# Altium footprint library FOOTPRINT.PcbLib: 132 footprints (part 4 of 9)
Each footprint in its own frame and in the unit in brackets; x right, y up, seen from the top. Pads: shape width x height; smd on the part's side, far side on the other; paste and mask are expansions set on the pad; w line width, h text height; cw(c..) or ccw(c..) is an arc to the next point about the centre after c.
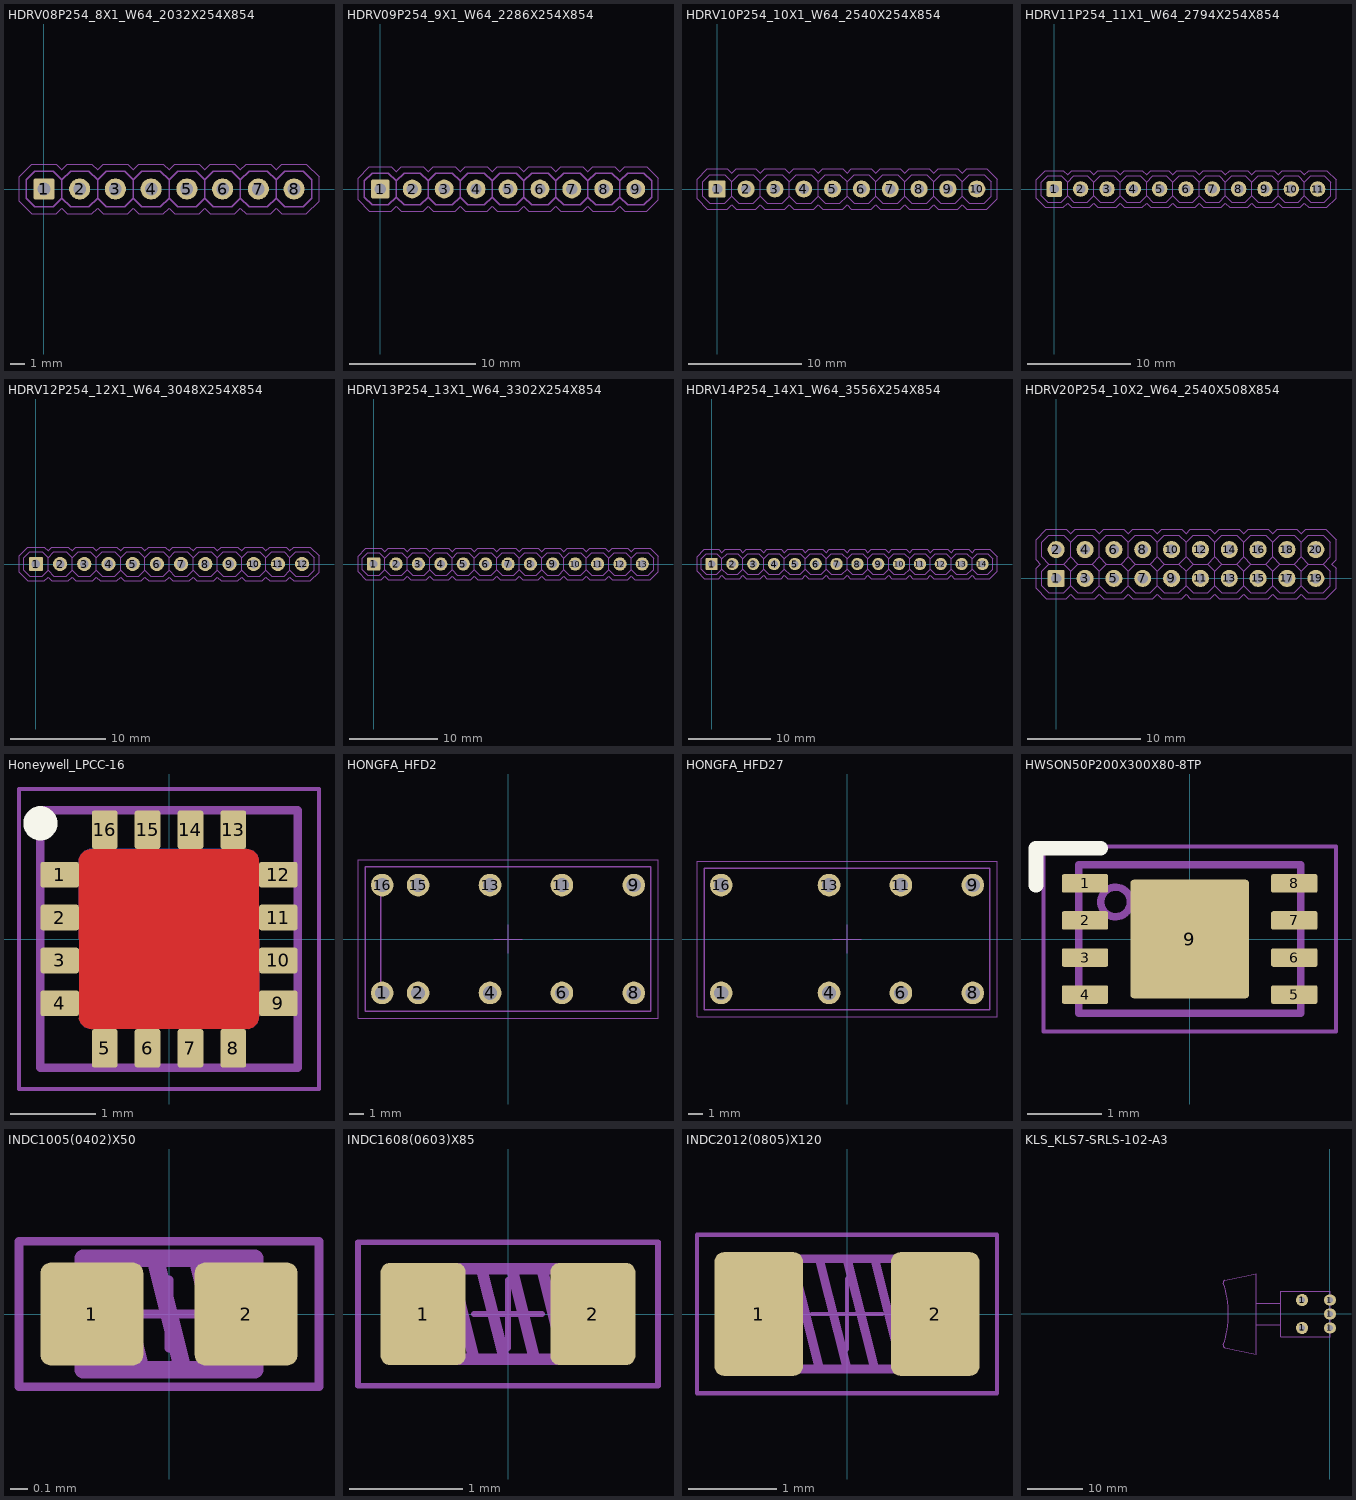
[diagram p3: the footprints below, top view; thin cyan lines are the x and y axes]

## HDRV08P254_8X1_W64_2032X254X854 [mm] "PLS-08, 2.54mm, 1 Row, Body 20.32x2.54mm, Lead Width 0.64mm"
height 8.54
pads (8):
  rrect20% 1.5x1.5 hole 0.9: 1(0,0)
  round 1.5 hole 0.9: 2(2.54,0) 3(5.08,0) 4(7.62,0) 5(10.16,0) 6(12.7,0) 7(15.24,0) 8(17.78,0)
Top Assembly:
  lines w0.1: 1.27,-0.65 1.27,0.65 ; 1.27,-0.65 1.89,-1.27 3.19,-1.27 3.81,-0.65 ; 1.27,-0.65 0.65,-1.27 -0.65,-1.27 -1.27,-0.65 -1.27,0.65 -0.65,1.27 0.65,1.27 1.27,0.65 ; 1.27,0.65 1.89,1.27 3.19,1.27 3.81,0.65 ; 3.81,-0.65 4.43,-1.27 5.73,-1.27 6.35,-0.65 ; 3.81,-0.65 3.81,0.65 ; 3.81,0.65 4.43,1.27 5.73,1.27 6.35,0.65 ; 6.35,-0.65 6.97,-1.27 8.27,-1.27 8.89,-0.65 ; 6.35,-0.65 6.35,0.65 ; 6.35,0.65 6.97,1.27 8.27,1.27 8.89,0.65 ; 8.89,-0.65 9.51,-1.27 10.81,-1.27 11.43,-0.65 ; 8.89,-0.65 8.89,0.65 ; 8.89,0.65 9.51,1.27 10.81,1.27 11.43,0.65 ; 11.43,-0.65 12.05,-1.27 13.35,-1.27 13.97,-0.65 ; 11.43,-0.65 11.43,0.65 ; 11.43,0.65 12.05,1.27 13.35,1.27 13.97,0.65 ; 13.97,-0.65 14.59,-1.27 15.89,-1.27 16.51,-0.65 ; 13.97,-0.65 13.97,0.65 ; 13.97,0.65 14.59,1.27 15.89,1.27 16.51,0.65 ; 16.51,-0.65 17.13,-1.27 18.43,-1.27 19.05,-0.65 19.05,0.65 18.43,1.27 17.13,1.27 16.51,0.65 ; 16.51,-0.65 16.51,0.65 ; -0.325,-0.325 0.325,-0.325 0.325,0.325 -0.325,0.325 -0.325,-0.325 ; 2.215,-0.325 2.215,0.325 2.865,0.325 2.865,-0.325 2.215,-0.325 ; 4.755,-0.325 4.755,0.325 5.405,0.325 5.405,-0.325 4.755,-0.325 ; 7.295,-0.325 7.945,-0.325 7.945,0.325 7.295,0.325 7.295,-0.325 ; 9.835,-0.325 9.835,0.325 10.485,0.325 10.485,-0.325 9.835,-0.325 ; 12.375,-0.325 13.025,-0.325 13.025,0.325 12.375,0.325 12.375,-0.325 ; 14.915,-0.325 15.565,-0.325 15.565,0.325 14.915,0.325 14.915,-0.325 ; 17.455,-0.325 17.455,0.325 18.105,0.325 18.105,-0.325 17.455,-0.325
Top Courtyard:
  lines w0.05: -1.775,-0.875 -1.775,0.875 -0.875,1.775 0.875,1.775 1.27,1.38 1.665,1.775 3.415,1.775 3.81,1.38 4.205,1.775 5.955,1.775 6.35,1.38 6.745,1.775 8.495,1.775 8.89,1.38 9.285,1.775 11.035,1.775 11.43,1.38 11.825,1.775 13.575,1.775 13.97,1.38 14.365,1.775 16.115,1.775 16.51,1.38 16.905,1.775 18.655,1.775 19.555,0.875 19.555,-0.875 18.655,-1.775 16.905,-1.775 16.51,-1.38 16.115,-1.775 14.365,-1.775 13.97,-1.38 13.575,-1.775 11.825,-1.775 11.43,-1.38 11.035,-1.775 9.285,-1.775 8.89,-1.38 8.495,-1.775 6.745,-1.775 6.35,-1.38 5.955,-1.775 4.205,-1.775 3.81,-1.38 3.415,-1.775 1.665,-1.775 1.27,-1.38 0.875,-1.775 -0.875,-1.775 -1.775,-0.875
Top Component Center:
  lines w0.05: -0.5,0 0.5,0 ; 0,-0.5 0,0.5
Top Designator:
  text "'.Comment'" at -1.14,1.48 h0.65
  text "'.Designator'" at -1.14,2.183 h0.65
3D body "PLS_PLS-08.x_t": height 8.54, standoff -3, extent -1.27,-1.27 19.05,1.27

## HDRV09P254_9X1_W64_2286X254X854 [mm] "PLS-09, 2.54mm, 1 Row, Body 22.86x2.54mm, Lead Width 0.64mm"
height 8.54
pads (9):
  rrect20% 1.5x1.5 hole 0.9: 1(0,0)
  round 1.5 hole 0.9: 2(2.54,0) 3(5.08,0) 4(7.62,0) 5(10.16,0) 6(12.7,0) 7(15.24,0) 8(17.78,0) 9(20.32,0)
Top Assembly:
  lines w0.1: 1.27,-0.65 0.65,-1.27 -0.65,-1.27 -1.27,-0.65 -1.27,0.65 -0.65,1.27 0.65,1.27 1.27,0.65 ; 1.27,-0.65 1.89,-1.27 3.19,-1.27 3.81,-0.65 ; 1.27,-0.65 1.27,0.65 ; 1.27,0.65 1.89,1.27 3.19,1.27 3.81,0.65 ; 3.81,-0.65 3.81,0.65 ; 3.81,-0.65 4.43,-1.27 5.73,-1.27 6.35,-0.65 ; 3.81,0.65 4.43,1.27 5.73,1.27 6.35,0.65 ; 6.35,-0.65 6.35,0.65 ; 6.35,-0.65 6.97,-1.27 8.27,-1.27 8.89,-0.65 ; 6.35,0.65 6.97,1.27 8.27,1.27 8.89,0.65 ; 8.89,-0.65 8.89,0.65 ; 8.89,-0.65 9.51,-1.27 10.81,-1.27 11.43,-0.65 ; 8.89,0.65 9.51,1.27 10.81,1.27 11.43,0.65 ; 11.43,-0.65 11.43,0.65 ; 11.43,-0.65 12.05,-1.27 13.35,-1.27 13.97,-0.65 ; 11.43,0.65 12.05,1.27 13.35,1.27 13.97,0.65 ; 13.97,-0.65 13.97,0.65 ; 13.97,-0.65 14.59,-1.27 15.89,-1.27 16.51,-0.65 ; 13.97,0.65 14.59,1.27 15.89,1.27 16.51,0.65 ; 16.51,-0.65 16.51,0.65 ; 16.51,-0.65 17.13,-1.27 18.43,-1.27 19.05,-0.65 ; 16.51,0.65 17.13,1.27 18.43,1.27 19.05,0.65 ; 19.05,-0.65 19.05,0.65 ; 19.05,-0.65 19.67,-1.27 20.97,-1.27 21.59,-0.65 21.59,0.65 20.97,1.27 19.67,1.27 19.05,0.65 ; -0.325,-0.325 -0.325,0.325 0.325,0.325 0.325,-0.325 -0.325,-0.325 ; 2.215,-0.325 2.865,-0.325 2.865,0.325 2.215,0.325 2.215,-0.325 ; 4.755,-0.325 4.755,0.325 5.405,0.325 5.405,-0.325 4.755,-0.325 ; 7.295,-0.325 7.295,0.325 7.945,0.325 7.945,-0.325 7.295,-0.325 ; 9.835,-0.325 10.485,-0.325 10.485,0.325 9.835,0.325 9.835,-0.325 ; 12.375,-0.325 12.375,0.325 13.025,0.325 13.025,-0.325 12.375,-0.325 ; 14.915,-0.325 15.565,-0.325 15.565,0.325 14.915,0.325 14.915,-0.325 ; 17.455,-0.325 18.105,-0.325 18.105,0.325 17.455,0.325 17.455,-0.325 ; 19.995,-0.325 19.995,0.325 20.645,0.325 20.645,-0.325 19.995,-0.325
Top Courtyard:
  lines w0.05: -1.775,-0.875 -0.875,-1.775 0.875,-1.775 1.27,-1.38 1.665,-1.775 3.415,-1.775 3.81,-1.38 4.205,-1.775 5.955,-1.775 6.35,-1.38 6.745,-1.775 8.495,-1.775 8.89,-1.38 9.285,-1.775 11.035,-1.775 11.43,-1.38 11.825,-1.775 13.575,-1.775 13.97,-1.38 14.365,-1.775 16.115,-1.775 16.51,-1.38 16.905,-1.775 18.655,-1.775 19.05,-1.38 19.445,-1.775 21.195,-1.775 22.095,-0.875 22.095,0.875 21.195,1.775 19.445,1.775 19.05,1.38 18.655,1.775 16.905,1.775 16.51,1.38 16.115,1.775 14.365,1.775 13.97,1.38 13.575,1.775 11.825,1.775 11.43,1.38 11.035,1.775 9.285,1.775 8.89,1.38 8.495,1.775 6.745,1.775 6.35,1.38 5.955,1.775 4.205,1.775 3.81,1.38 3.415,1.775 1.665,1.775 1.27,1.38 0.875,1.775 -0.875,1.775 -1.775,0.875 -1.775,-0.875
Top Component Center:
  lines w0.05: -0.5,0 0.5,0 ; 0,-0.5 0,0.5
Top Designator:
  text "'.Designator'" at -1.14,2.183 h0.65
  text "'.Comment'" at -1.14,1.48 h0.65
3D body "PLS_PLS-09.x_t": height 8.54, standoff -3, extent -1.27,-1.27 21.59,1.27

## HDRV10P254_10X1_W64_2540X254X854 [mm] "PLS-10, 2.54mm, 1 Row, Body 25.40x2.54mm, Lead Width 0.64mm"
height 8.54
pads (10):
  rrect20% 1.5x1.5 hole 0.9: 1(0,0)
  round 1.5 hole 0.9: 2(2.54,0) 3(5.08,0) 4(7.62,0) 5(10.16,0) 6(12.7,0) 7(15.24,0) 8(17.78,0) 9(20.32,0) 10(22.86,0)
Top Assembly:
  lines w0.1: 1.27,-0.65 0.65,-1.27 -0.65,-1.27 -1.27,-0.65 -1.27,0.65 -0.65,1.27 0.65,1.27 1.27,0.65 ; 1.27,-0.65 1.89,-1.27 3.19,-1.27 3.81,-0.65 ; 1.27,-0.65 1.27,0.65 ; 1.27,0.65 1.89,1.27 3.19,1.27 3.81,0.65 ; 3.81,-0.65 3.81,0.65 ; 3.81,-0.65 4.43,-1.27 5.73,-1.27 6.35,-0.65 ; 3.81,0.65 4.43,1.27 5.73,1.27 6.35,0.65 ; 6.35,-0.65 6.35,0.65 ; 6.35,-0.65 6.97,-1.27 8.27,-1.27 8.89,-0.65 ; 6.35,0.65 6.97,1.27 8.27,1.27 8.89,0.65 ; 8.89,-0.65 8.89,0.65 ; 8.89,-0.65 9.51,-1.27 10.81,-1.27 11.43,-0.65 ; 8.89,0.65 9.51,1.27 10.81,1.27 11.43,0.65 ; 11.43,-0.65 11.43,0.65 ; 11.43,-0.65 12.05,-1.27 13.35,-1.27 13.97,-0.65 ; 11.43,0.65 12.05,1.27 13.35,1.27 13.97,0.65 ; 13.97,-0.65 13.97,0.65 ; 13.97,-0.65 14.59,-1.27 15.89,-1.27 16.51,-0.65 ; 13.97,0.65 14.59,1.27 15.89,1.27 16.51,0.65 ; 16.51,-0.65 16.51,0.65 ; 16.51,-0.65 17.13,-1.27 18.43,-1.27 19.05,-0.65 ; 16.51,0.65 17.13,1.27 18.43,1.27 19.05,0.65 ; 19.05,-0.65 19.05,0.65 ; 19.05,-0.65 19.67,-1.27 20.97,-1.27 21.59,-0.65 ; 19.05,0.65 19.67,1.27 20.97,1.27 21.59,0.65 ; 21.59,-0.65 21.59,0.65 ; 21.59,-0.65 22.21,-1.27 23.51,-1.27 24.13,-0.65 24.13,0.65 23.51,1.27 22.21,1.27 21.59,0.65 ; -0.325,-0.325 -0.325,0.325 0.325,0.325 0.325,-0.325 -0.325,-0.325 ; 2.215,-0.325 2.215,0.325 2.865,0.325 2.865,-0.325 2.215,-0.325 ; 4.755,-0.325 5.405,-0.325 5.405,0.325 4.755,0.325 4.755,-0.325 ; 7.295,-0.325 7.295,0.325 7.945,0.325 7.945,-0.325 7.295,-0.325 ; 9.835,-0.325 9.835,0.325 10.485,0.325 10.485,-0.325 9.835,-0.325 ; 12.375,-0.325 13.025,-0.325 13.025,0.325 12.375,0.325 12.375,-0.325 ; 14.915,-0.325 14.915,0.325 15.565,0.325 15.565,-0.325 14.915,-0.325 ; 17.455,-0.325 18.105,-0.325 18.105,0.325 17.455,0.325 17.455,-0.325 ; 19.995,-0.325 20.645,-0.325 20.645,0.325 19.995,0.325 19.995,-0.325 ; 22.535,-0.325 22.535,0.325 23.185,0.325 23.185,-0.325 22.535,-0.325
Top Courtyard:
  lines w0.05: -1.775,-0.875 -0.875,-1.775 0.875,-1.775 1.27,-1.38 1.665,-1.775 3.415,-1.775 3.81,-1.38 4.205,-1.775 5.955,-1.775 6.35,-1.38 6.745,-1.775 8.495,-1.775 8.89,-1.38 9.285,-1.775 11.035,-1.775 11.43,-1.38 11.825,-1.775 13.575,-1.775 13.97,-1.38 14.365,-1.775 16.115,-1.775 16.51,-1.38 16.905,-1.775 18.655,-1.775 19.05,-1.38 19.445,-1.775 21.195,-1.775 21.59,-1.38 21.985,-1.775 23.735,-1.775 24.635,-0.875 24.635,0.875 23.735,1.775 21.985,1.775 21.59,1.38 21.195,1.775 19.445,1.775 19.05,1.38 18.655,1.775 16.905,1.775 16.51,1.38 16.115,1.775 14.365,1.775 13.97,1.38 13.575,1.775 11.825,1.775 11.43,1.38 11.035,1.775 9.285,1.775 8.89,1.38 8.495,1.775 6.745,1.775 6.35,1.38 5.955,1.775 4.205,1.775 3.81,1.38 3.415,1.775 1.665,1.775 1.27,1.38 0.875,1.775 -0.875,1.775 -1.775,0.875 -1.775,-0.875
Top Component Center:
  lines w0.05: -0.5,0 0.5,0 ; 0,-0.5 0,0.5
Top Designator:
  text "'.Designator'" at -1.14,2.183 h0.65
  text "'.Comment'" at -1.14,1.48 h0.65
3D body "PLS_PLS-10.x_t": height 8.54, standoff -3, extent -1.27,-1.27 24.13,1.27

## HDRV11P254_11X1_W64_2794X254X854 [mm] "PLS-11, 2.54mm, 1 Row, Body 27.94x2.54mm, Lead Width 0.64mm"
height 8.54
pads (11):
  rrect20% 1.5x1.5 hole 0.9: 1(0,0)
  round 1.5 hole 0.9: 2(2.54,0) 3(5.08,0) 4(7.62,0) 5(10.16,0) 6(12.7,0) 7(15.24,0) 8(17.78,0) 9(20.32,0) 10(22.86,0) 11(25.4,0)
Top Assembly:
  lines w0.1: 1.27,-0.65 1.27,0.65 ; 1.27,-0.65 1.89,-1.27 3.19,-1.27 3.81,-0.65 ; 1.27,-0.65 0.65,-1.27 -0.65,-1.27 -1.27,-0.65 -1.27,0.65 -0.65,1.27 0.65,1.27 1.27,0.65 ; 1.27,0.65 1.89,1.27 3.19,1.27 3.81,0.65 ; 3.81,-0.65 4.43,-1.27 5.73,-1.27 6.35,-0.65 ; 3.81,-0.65 3.81,0.65 ; 3.81,0.65 4.43,1.27 5.73,1.27 6.35,0.65 ; 6.35,-0.65 6.97,-1.27 8.27,-1.27 8.89,-0.65 ; 6.35,-0.65 6.35,0.65 ; 6.35,0.65 6.97,1.27 8.27,1.27 8.89,0.65 ; 8.89,-0.65 9.51,-1.27 10.81,-1.27 11.43,-0.65 ; 8.89,-0.65 8.89,0.65 ; 8.89,0.65 9.51,1.27 10.81,1.27 11.43,0.65 ; 11.43,-0.65 12.05,-1.27 13.35,-1.27 13.97,-0.65 ; 11.43,-0.65 11.43,0.65 ; 11.43,0.65 12.05,1.27 13.35,1.27 13.97,0.65 ; 13.97,-0.65 14.59,-1.27 15.89,-1.27 16.51,-0.65 ; 13.97,-0.65 13.97,0.65 ; 13.97,0.65 14.59,1.27 15.89,1.27 16.51,0.65 ; 16.51,-0.65 17.13,-1.27 18.43,-1.27 19.05,-0.65 ; 16.51,-0.65 16.51,0.65 ; 16.51,0.65 17.13,1.27 18.43,1.27 19.05,0.65 ; 19.05,-0.65 19.67,-1.27 20.97,-1.27 21.59,-0.65 ; 19.05,-0.65 19.05,0.65 ; 19.05,0.65 19.67,1.27 20.97,1.27 21.59,0.65 ; 21.59,-0.65 22.21,-1.27 23.51,-1.27 24.13,-0.65 ; 21.59,-0.65 21.59,0.65 ; 21.59,0.65 22.21,1.27 23.51,1.27 24.13,0.65 ; 24.13,-0.65 24.75,-1.27 26.05,-1.27 26.67,-0.65 26.67,0.65 26.05,1.27 24.75,1.27 24.13,0.65 ; 24.13,-0.65 24.13,0.65 ; -0.325,-0.325 0.325,-0.325 0.325,0.325 -0.325,0.325 -0.325,-0.325 ; 2.215,-0.325 2.215,0.325 2.865,0.325 2.865,-0.325 2.215,-0.325 ; 4.755,-0.325 4.755,0.325 5.405,0.325 5.405,-0.325 4.755,-0.325 ; 7.295,-0.325 7.945,-0.325 7.945,0.325 7.295,0.325 7.295,-0.325 ; 9.835,-0.325 9.835,0.325 10.485,0.325 10.485,-0.325 9.835,-0.325 ; 12.375,-0.325 12.375,0.325 13.025,0.325 13.025,-0.325 12.375,-0.325 ; 14.915,-0.325 15.565,-0.325 15.565,0.325 14.915,0.325 14.915,-0.325 ; 17.455,-0.325 17.455,0.325 18.105,0.325 18.105,-0.325 17.455,-0.325 ; 19.995,-0.325 20.645,-0.325 20.645,0.325 19.995,0.325 19.995,-0.325 ; 22.535,-0.325 23.185,-0.325 23.185,0.325 22.535,0.325 22.535,-0.325 ; 25.075,-0.325 25.075,0.325 25.725,0.325 25.725,-0.325 25.075,-0.325
Top Courtyard:
  lines w0.05: -1.775,-0.875 -1.775,0.875 -0.875,1.775 0.875,1.775 1.27,1.38 1.665,1.775 3.415,1.775 3.81,1.38 4.205,1.775 5.955,1.775 6.35,1.38 6.745,1.775 8.495,1.775 8.89,1.38 9.285,1.775 11.035,1.775 11.43,1.38 11.825,1.775 13.575,1.775 13.97,1.38 14.365,1.775 16.115,1.775 16.51,1.38 16.905,1.775 18.655,1.775 19.05,1.38 19.445,1.775 21.195,1.775 21.59,1.38 21.985,1.775 23.735,1.775 24.13,1.38 24.525,1.775 26.275,1.775 27.175,0.875 27.175,-0.875 26.275,-1.775 24.525,-1.775 24.13,-1.38 23.735,-1.775 21.985,-1.775 21.59,-1.38 21.195,-1.775 19.445,-1.775 19.05,-1.38 18.655,-1.775 16.905,-1.775 16.51,-1.38 16.115,-1.775 14.365,-1.775 13.97,-1.38 13.575,-1.775 11.825,-1.775 11.43,-1.38 11.035,-1.775 9.285,-1.775 8.89,-1.38 8.495,-1.775 6.745,-1.775 6.35,-1.38 5.955,-1.775 4.205,-1.775 3.81,-1.38 3.415,-1.775 1.665,-1.775 1.27,-1.38 0.875,-1.775 -0.875,-1.775 -1.775,-0.875
Top Component Center:
  lines w0.05: -0.5,0 0.5,0 ; 0,-0.5 0,0.5
Top Designator:
  text "'.Comment'" at -1.14,1.48 h0.65
  text "'.Designator'" at -1.14,2.183 h0.65
3D body "PLS_PLS-11.x_t": height 8.54, standoff -3, extent -1.27,-1.27 26.67,1.27

## HDRV12P254_12X1_W64_3048X254X854 [mm] "PLS-12, 2.54mm, 1 Row, Body 30.48x2.54mm, Lead Width 0.64mm"
height 8.54
pads (12):
  rrect20% 1.5x1.5 hole 0.9: 1(0,0)
  round 1.5 hole 0.9: 2(2.54,0) 3(5.08,0) 4(7.62,0) 5(10.16,0) 6(12.7,0) 7(15.24,0) 8(17.78,0) 9(20.32,0) 10(22.86,0) 11(25.4,0) 12(27.94,0)
Top Assembly:
  lines w0.1: 1.27,-0.65 1.27,0.65 ; 1.27,-0.65 1.89,-1.27 3.19,-1.27 3.81,-0.65 ; 1.27,-0.65 0.65,-1.27 -0.65,-1.27 -1.27,-0.65 -1.27,0.65 -0.65,1.27 0.65,1.27 1.27,0.65 ; 1.27,0.65 1.89,1.27 3.19,1.27 3.81,0.65 ; 3.81,-0.65 4.43,-1.27 5.73,-1.27 6.35,-0.65 ; 3.81,-0.65 3.81,0.65 ; 3.81,0.65 4.43,1.27 5.73,1.27 6.35,0.65 ; 6.35,-0.65 6.97,-1.27 8.27,-1.27 8.89,-0.65 ; 6.35,-0.65 6.35,0.65 ; 6.35,0.65 6.97,1.27 8.27,1.27 8.89,0.65 ; 8.89,-0.65 9.51,-1.27 10.81,-1.27 11.43,-0.65 ; 8.89,-0.65 8.89,0.65 ; 8.89,0.65 9.51,1.27 10.81,1.27 11.43,0.65 ; 11.43,-0.65 12.05,-1.27 13.35,-1.27 13.97,-0.65 ; 11.43,-0.65 11.43,0.65 ; 11.43,0.65 12.05,1.27 13.35,1.27 13.97,0.65 ; 13.97,-0.65 14.59,-1.27 15.89,-1.27 16.51,-0.65 ; 13.97,-0.65 13.97,0.65 ; 13.97,0.65 14.59,1.27 15.89,1.27 16.51,0.65 ; 16.51,-0.65 17.13,-1.27 18.43,-1.27 19.05,-0.65 ; 16.51,-0.65 16.51,0.65 ; 16.51,0.65 17.13,1.27 18.43,1.27 19.05,0.65 ; 19.05,-0.65 19.67,-1.27 20.97,-1.27 21.59,-0.65 ; 19.05,-0.65 19.05,0.65 ; 19.05,0.65 19.67,1.27 20.97,1.27 21.59,0.65 ; 21.59,-0.65 22.21,-1.27 23.51,-1.27 24.13,-0.65 ; 21.59,-0.65 21.59,0.65 ; 21.59,0.65 22.21,1.27 23.51,1.27 24.13,0.65 ; 24.13,-0.65 24.75,-1.27 26.05,-1.27 26.67,-0.65 ; 24.13,-0.65 24.13,0.65 ; 24.13,0.65 24.75,1.27 26.05,1.27 26.67,0.65 ; 26.67,-0.65 27.29,-1.27 28.59,-1.27 29.21,-0.65 29.21,0.65 28.59,1.27 27.29,1.27 26.67,0.65 ; 26.67,-0.65 26.67,0.65 ; -0.325,-0.325 0.325,-0.325 0.325,0.325 -0.325,0.325 -0.325,-0.325 ; 2.215,-0.325 2.215,0.325 2.865,0.325 2.865,-0.325 2.215,-0.325 ; 4.755,-0.325 5.405,-0.325 5.405,0.325 4.755,0.325 4.755,-0.325 ; 7.295,-0.325 7.945,-0.325 7.945,0.325 7.295,0.325 7.295,-0.325 ; 9.835,-0.325 9.835,0.325 10.485,0.325 10.485,-0.325 9.835,-0.325 ; 12.375,-0.325 13.025,-0.325 13.025,0.325 12.375,0.325 12.375,-0.325 ; 14.915,-0.325 15.565,-0.325 15.565,0.325 14.915,0.325 14.915,-0.325 ; 17.455,-0.325 17.455,0.325 18.105,0.325 18.105,-0.325 17.455,-0.325 ; 19.995,-0.325 20.645,-0.325 20.645,0.325 19.995,0.325 19.995,-0.325 ; 22.535,-0.325 22.535,0.325 23.185,0.325 23.185,-0.325 22.535,-0.325 ; 25.075,-0.325 25.075,0.325 25.725,0.325 25.725,-0.325 25.075,-0.325 ; 27.615,-0.325 28.265,-0.325 28.265,0.325 27.615,0.325 27.615,-0.325
Top Courtyard:
  lines w0.05: -1.775,-0.875 -1.775,0.875 -0.875,1.775 0.875,1.775 1.27,1.38 1.665,1.775 3.415,1.775 3.81,1.38 4.205,1.775 5.955,1.775 6.35,1.38 6.745,1.775 8.495,1.775 8.89,1.38 9.285,1.775 11.035,1.775 11.43,1.38 11.825,1.775 13.575,1.775 13.97,1.38 14.365,1.775 16.115,1.775 16.51,1.38 16.905,1.775 18.655,1.775 19.05,1.38 19.445,1.775 21.195,1.775 21.59,1.38 21.985,1.775 23.735,1.775 24.13,1.38 24.525,1.775 26.275,1.775 26.67,1.38 27.065,1.775 28.815,1.775 29.715,0.875 29.715,-0.875 28.815,-1.775 27.065,-1.775 26.67,-1.38 26.275,-1.775 24.525,-1.775 24.13,-1.38 23.735,-1.775 21.985,-1.775 21.59,-1.38 21.195,-1.775 19.445,-1.775 19.05,-1.38 18.655,-1.775 16.905,-1.775 16.51,-1.38 16.115,-1.775 14.365,-1.775 13.97,-1.38 13.575,-1.775 11.825,-1.775 11.43,-1.38 11.035,-1.775 9.285,-1.775 8.89,-1.38 8.495,-1.775 6.745,-1.775 6.35,-1.38 5.955,-1.775 4.205,-1.775 3.81,-1.38 3.415,-1.775 1.665,-1.775 1.27,-1.38 0.875,-1.775 -0.875,-1.775 -1.775,-0.875
Top Component Center:
  lines w0.05: -0.5,0 0.5,0 ; 0,-0.5 0,0.5
Top Designator:
  text "'.Comment'" at -1.14,1.48 h0.65
  text "'.Designator'" at -1.14,2.183 h0.65
3D body "PLS_PLS-12.x_t": height 8.54, standoff -3, extent -1.27,-1.27 29.21,1.27

## HDRV13P254_13X1_W64_3302X254X854 [mm] "PLS-13, 2.54mm, 1 Row, Body 33.02x2.54mm, Lead Width 0.64mm"
height 8.54
pads (13):
  rrect20% 1.5x1.5 hole 0.9: 1(0,0)
  round 1.5 hole 0.9: 2(2.54,0) 3(5.08,0) 4(7.62,0) 5(10.16,0) 6(12.7,0) 7(15.24,0) 8(17.78,0) 9(20.32,0) 10(22.86,0) 11(25.4,0) 12(27.94,0) 13(30.48,0)
Top Assembly:
  lines w0.1: 1.27,-0.65 1.27,0.65 ; 1.27,-0.65 1.89,-1.27 3.19,-1.27 3.81,-0.65 ; 1.27,-0.65 0.65,-1.27 -0.65,-1.27 -1.27,-0.65 -1.27,0.65 -0.65,1.27 0.65,1.27 1.27,0.65 ; 1.27,0.65 1.89,1.27 3.19,1.27 3.81,0.65 ; 3.81,-0.65 4.43,-1.27 5.73,-1.27 6.35,-0.65 ; 3.81,-0.65 3.81,0.65 ; 3.81,0.65 4.43,1.27 5.73,1.27 6.35,0.65 ; 6.35,-0.65 6.97,-1.27 8.27,-1.27 8.89,-0.65 ; 6.35,-0.65 6.35,0.65 ; 6.35,0.65 6.97,1.27 8.27,1.27 8.89,0.65 ; 8.89,-0.65 9.51,-1.27 10.81,-1.27 11.43,-0.65 ; 8.89,-0.65 8.89,0.65 ; 8.89,0.65 9.51,1.27 10.81,1.27 11.43,0.65 ; 11.43,-0.65 12.05,-1.27 13.35,-1.27 13.97,-0.65 ; 11.43,-0.65 11.43,0.65 ; 11.43,0.65 12.05,1.27 13.35,1.27 13.97,0.65 ; 13.97,-0.65 14.59,-1.27 15.89,-1.27 16.51,-0.65 ; 13.97,-0.65 13.97,0.65 ; 13.97,0.65 14.59,1.27 15.89,1.27 16.51,0.65 ; 16.51,-0.65 17.13,-1.27 18.43,-1.27 19.05,-0.65 ; 16.51,-0.65 16.51,0.65 ; 16.51,0.65 17.13,1.27 18.43,1.27 19.05,0.65 ; 19.05,-0.65 19.67,-1.27 20.97,-1.27 21.59,-0.65 ; 19.05,-0.65 19.05,0.65 ; 19.05,0.65 19.67,1.27 20.97,1.27 21.59,0.65 ; 21.59,-0.65 22.21,-1.27 23.51,-1.27 24.13,-0.65 ; 21.59,-0.65 21.59,0.65 ; 21.59,0.65 22.21,1.27 23.51,1.27 24.13,0.65 ; 24.13,-0.65 24.75,-1.27 26.05,-1.27 26.67,-0.65 ; 24.13,-0.65 24.13,0.65 ; 24.13,0.65 24.75,1.27 26.05,1.27 26.67,0.65 ; 26.67,-0.65 27.29,-1.27 28.59,-1.27 29.21,-0.65 ; 26.67,-0.65 26.67,0.65 ; 26.67,0.65 27.29,1.27 28.59,1.27 29.21,0.65 ; 29.21,-0.65 29.83,-1.27 31.13,-1.27 31.75,-0.65 31.75,0.65 31.13,1.27 29.83,1.27 29.21,0.65 ; 29.21,-0.65 29.21,0.65 ; -0.325,-0.325 0.325,-0.325 0.325,0.325 -0.325,0.325 -0.325,-0.325 ; 2.215,-0.325 2.865,-0.325 2.865,0.325 2.215,0.325 2.215,-0.325 ; 4.755,-0.325 4.755,0.325 5.405,0.325 5.405,-0.325 4.755,-0.325 ; 7.295,-0.325 7.295,0.325 7.945,0.325 7.945,-0.325 7.295,-0.325 ; 9.835,-0.325 10.485,-0.325 10.485,0.325 9.835,0.325 9.835,-0.325 ; 12.375,-0.325 12.375,0.325 13.025,0.325 13.025,-0.325 12.375,-0.325 ; 14.915,-0.325 14.915,0.325 15.565,0.325 15.565,-0.325 14.915,-0.325 ; 17.455,-0.325 18.105,-0.325 18.105,0.325 17.455,0.325 17.455,-0.325 ; 19.995,-0.325 19.995,0.325 20.645,0.325 20.645,-0.325 19.995,-0.325 ; 22.535,-0.325 23.185,-0.325 23.185,0.325 22.535,0.325 22.535,-0.325 ; 25.075,-0.325 25.725,-0.325 25.725,0.325 25.075,0.325 25.075,-0.325 ; 27.615,-0.325 27.615,0.325 28.265,0.325 28.265,-0.325 27.615,-0.325 ; 30.155,-0.325 30.155,0.325 30.805,0.325 30.805,-0.325 30.155,-0.325
Top Courtyard:
  lines w0.05: -1.775,-0.875 -1.775,0.875 -0.875,1.775 0.875,1.775 1.27,1.38 1.665,1.775 3.415,1.775 3.81,1.38 4.205,1.775 5.955,1.775 6.35,1.38 6.745,1.775 8.495,1.775 8.89,1.38 9.285,1.775 11.035,1.775 11.43,1.38 11.825,1.775 13.575,1.775 13.97,1.38 14.365,1.775 16.115,1.775 16.51,1.38 16.905,1.775 18.655,1.775 19.05,1.38 19.445,1.775 21.195,1.775 21.59,1.38 21.985,1.775 23.735,1.775 24.13,1.38 24.525,1.775 26.275,1.775 26.67,1.38 27.065,1.775 28.815,1.775 29.21,1.38 29.605,1.775 31.355,1.775 32.255,0.875 32.255,-0.875 31.355,-1.775 29.605,-1.775 29.21,-1.38 28.815,-1.775 27.065,-1.775 26.67,-1.38 26.275,-1.775 24.525,-1.775 24.13,-1.38 23.735,-1.775 21.985,-1.775 21.59,-1.38 21.195,-1.775 19.445,-1.775 19.05,-1.38 18.655,-1.775 16.905,-1.775 16.51,-1.38 16.115,-1.775 14.365,-1.775 13.97,-1.38 13.575,-1.775 11.825,-1.775 11.43,-1.38 11.035,-1.775 9.285,-1.775 8.89,-1.38 8.495,-1.775 6.745,-1.775 6.35,-1.38 5.955,-1.775 4.205,-1.775 3.81,-1.38 3.415,-1.775 1.665,-1.775 1.27,-1.38 0.875,-1.775 -0.875,-1.775 -1.775,-0.875
Top Component Center:
  lines w0.05: -0.5,0 0.5,0 ; 0,-0.5 0,0.5
Top Designator:
  text "'.Comment'" at -1.14,1.48 h0.65
  text "'.Designator'" at -1.14,2.183 h0.65
3D body "PLS_PLS-13.x_t": height 8.54, standoff -3, extent -1.27,-1.27 31.75,1.27

## HDRV14P254_14X1_W64_3556X254X854 [mm] "PLS-14, 2.54mm, 1 Row, Body 35.56x2.54mm, Lead Width 0.64mm"
height 8.54
pads (14):
  rrect20% 1.5x1.5 hole 0.9: 1(0,0)
  round 1.5 hole 0.9: 2(2.54,0) 3(5.08,0) 4(7.62,0) 5(10.16,0) 6(12.7,0) 7(15.24,0) 8(17.78,0) 9(20.32,0) 10(22.86,0) 11(25.4,0) 12(27.94,0) 13(30.48,0) 14(33.02,0)
Top Assembly:
  drawing of 155 lines, arcs and shapes, not listed
Top Courtyard:
  lines w0.05: -1.775,-0.875 -1.775,0.875 -0.875,1.775 0.875,1.775 1.27,1.38 1.665,1.775 3.415,1.775 3.81,1.38 4.205,1.775 5.955,1.775 6.35,1.38 6.745,1.775 8.495,1.775 8.89,1.38 9.285,1.775 11.035,1.775 11.43,1.38 11.825,1.775 13.575,1.775 13.97,1.38 14.365,1.775 16.115,1.775 16.51,1.38 16.905,1.775 18.655,1.775 19.05,1.38 19.445,1.775 21.195,1.775 21.59,1.38 21.985,1.775 23.735,1.775 24.13,1.38 24.525,1.775 26.275,1.775 26.67,1.38 27.065,1.775 28.815,1.775 29.21,1.38 29.605,1.775 31.355,1.775 31.75,1.38 32.145,1.775 33.895,1.775 34.795,0.875 34.795,-0.875 33.895,-1.775 32.145,-1.775 31.75,-1.38 31.355,-1.775 29.605,-1.775 29.21,-1.38 28.815,-1.775 27.065,-1.775 26.67,-1.38 26.275,-1.775 24.525,-1.775 24.13,-1.38 23.735,-1.775 21.985,-1.775 21.59,-1.38 21.195,-1.775 19.445,-1.775 19.05,-1.38 18.655,-1.775 16.905,-1.775 16.51,-1.38 16.115,-1.775 14.365,-1.775 13.97,-1.38 13.575,-1.775 11.825,-1.775 11.43,-1.38 11.035,-1.775 9.285,-1.775 8.89,-1.38 8.495,-1.775 6.745,-1.775 6.35,-1.38 5.955,-1.775 4.205,-1.775 3.81,-1.38 3.415,-1.775 1.665,-1.775 1.27,-1.38 0.875,-1.775 -0.875,-1.775 -1.775,-0.875
Top Component Center:
  lines w0.05: -0.5,0 0.5,0 ; 0,-0.5 0,0.5
Top Designator:
  text "'.Comment'" at -1.14,1.48 h0.65
  text "'.Designator'" at -1.14,2.183 h0.65
3D body "PLS_PLS-14.x_t": height 8.54, standoff -3, extent -1.27,-1.27 34.29,1.27

## HDRV20P254_10X2_W64_2540X508X854 [mm] "PLD-20, 2.54mm, 1 Row, Body 25.40x5.08mm, Lead Width 0.64mm"
height 8.54
pads (20):
  rrect20% 1.5x1.5 hole 0.9: 1(0,0)
  round 1.5 hole 0.9: 2(0,2.54) 3(2.54,0) 4(2.54,2.54) 5(5.08,0) 6(5.08,2.54) 7(7.62,0) 8(7.62,2.54) 9(10.16,0) 10(10.16,2.54) 11(12.7,0) 12(12.7,2.54) 13(15.24,0) 14(15.24,2.54) 15(17.78,0) 16(17.78,2.54) 17(20.32,0) 18(20.32,2.54) 19(22.86,0) 20(22.86,2.54)
Top Assembly:
  drawing of 212 lines, arcs and shapes, not listed
Top Courtyard:
  lines w0.05: -1.775,-0.875 -1.775,0.875 -1.38,1.27 -1.775,1.665 -1.775,3.415 -0.875,4.315 0.875,4.315 1.27,3.92 1.665,4.315 3.415,4.315 3.81,3.92 4.205,4.315 5.955,4.315 6.35,3.92 6.745,4.315 8.495,4.315 8.89,3.92 9.285,4.315 11.035,4.315 11.43,3.92 11.825,4.315 13.575,4.315 13.97,3.92 14.365,4.315 16.115,4.315 16.51,3.92 16.905,4.315 18.655,4.315 19.05,3.92 19.445,4.315 21.195,4.315 21.59,3.92 21.985,4.315 23.735,4.315 24.635,3.415 24.635,1.665 24.24,1.27 24.635,0.875 24.635,-0.875 23.735,-1.775 21.985,-1.775 21.59,-1.38 21.195,-1.775 19.445,-1.775 19.05,-1.38 18.655,-1.775 16.905,-1.775 16.51,-1.38 16.115,-1.775 14.365,-1.775 13.97,-1.38 13.575,-1.775 11.825,-1.775 11.43,-1.38 11.035,-1.775 9.285,-1.775 8.89,-1.38 8.495,-1.775 6.745,-1.775 6.35,-1.38 5.955,-1.775 4.205,-1.775 3.81,-1.38 3.415,-1.775 1.665,-1.775 1.27,-1.38 0.875,-1.775 -0.875,-1.775 -1.775,-0.875
Top Component Center:
  lines w0.05: -0.5,0 0.5,0 ; 0,-0.5 0,0.5
Top Designator:
  text "'.Comment'" at -1.14,4.02 h0.65
  text "'.Designator'" at -1.14,4.723 h0.65
3D body "PLS_PLS-10.x_t": height 8.54, standoff -3, extent -1.27,-1.27 24.13,1.27
3D body "PLS_PLS-10.x_t": height 8.54, standoff -3, extent -1.27,1.27 24.13,3.81

## Honeywell_LPCC-16 [mm]
pads (16):
  rrect20% 0.45x0.3 smd: 1(-1.275,0.75) 2(-1.275,0.25) 3(-1.275,-0.25) 4(-1.275,-0.75) 9(1.275,-0.75) 10(1.275,-0.25) 11(1.275,0.25) 12(1.275,0.75)
  rrect20% 0.3x0.45 smd: 5(-0.75,-1.275) 6(-0.25,-1.275) 7(0.25,-1.275) 8(0.75,-1.275) 13(0.75,1.275) 14(0.25,1.275) 15(-0.25,1.275) 16(-0.75,1.275)
Top:
  pour cut-out: -0.9,-1.05 0.9,-1.05 0.93,-1.05 0.985,-1.027 1.027,-0.985 1.05,-0.93 1.05,-0.9 1.05,0.9 1.05,0.93 1.027,0.985 0.985,1.027 0.93,1.05 0.9,1.05 -0.9,1.05 -0.93,1.05 -0.985,1.027 -1.027,0.985 -1.05,0.93 -1.05,0.9 -1.05,-0.9 -1.05,-0.93 -1.027,-0.985 -0.985,-1.027 -0.93,-1.05
Bot:
  pour cut-out: -0.9,-1.05 0.9,-1.05 0.93,-1.05 0.985,-1.027 1.027,-0.985 1.05,-0.93 1.05,-0.9 1.05,0.9 1.05,0.93 1.027,0.985 0.985,1.027 0.93,1.05 0.9,1.05 -0.9,1.05 -0.93,1.05 -0.985,1.027 -1.027,0.985 -1.05,0.93 -1.05,0.9 -1.05,-0.9 -1.05,-0.93 -1.027,-0.985 -0.985,-1.027 -0.93,-1.05
Top Overlay:
  circle w0.2: c-1.5,1.35 r0.1
Top Assembly:
  lines w0.1: -1.5,-1.5 -1.5,1.5 1.5,1.5 1.5,-1.5 -1.5,-1.5
Top Component Center:
  lines w0.05: -0.5,0 0.5,0 ; 0,-0.5 0,0.5 ; -1.75,-1.75 -1.75,1.75 1.75,1.75 1.75,-1.75 -1.75,-1.75
Top Designator:
  text "'.Designator'" at -1.14,0.703 h0.65
  text "'.Comment'" at -1.14,0 h0.65
3D body: height 0.89, standoff 0.05, extent -1.264,0.986 -0.986,1.264
3D body: height 0.9, standoff 0.05, extent -1.5,-1.5 1.5,1.5

## HONGFA_HFD2 [mm]
height 10.6
pads (10):
  round 1.6 hole 1: 1(-8.89,-3.81) 2(-6.35,-3.81) 4(-1.27,-3.81) 6(3.81,-3.81) 8(8.89,-3.81) 9(8.89,3.81) 11(3.81,3.81) 13(-1.27,3.81) 15(-6.35,3.81) 16(-8.89,3.81)
Top Assembly:
  lines w0.1: -9,-3.5 -9,3.5 ; -10.1,-5.1 10.1,-5.1 10.1,5.1 -10.1,5.1 -10.1,-5.1
Top Courtyard:
  lines w0.05: -10.6,-5.6 -10.6,5.6 10.6,5.6 10.6,-5.6 -10.6,-5.6
Top Component Center:
  lines w0.05: -1,0 1,0 ; 0,-1 0,1
Top Designator:
  text "'.Designator'" at -1.64,0.203 h0.65
  text "'.Comment'" at -1.64,-0.5 h0.65
3D body "HONGFA_HFD2.x_t": height 10.61, standoff -2.99, extent -10.1,-5.1 10.1,5.1

## HONGFA_HFD27 [mm]
height 11.5
pads (8):
  round 1.6 hole 1: 1(-8.89,-3.81) 4(-1.27,-3.81) 6(3.81,-3.81) 8(8.89,-3.81) 9(8.89,3.81) 11(3.81,3.81) 13(-1.27,3.81) 16(-8.89,3.81)
Top Assembly:
  lines w0.1: -10.1,-5 -10.1,5 10.1,5 10.1,-5 -10.1,-5
Top Courtyard:
  lines w0.05: -10.6,-5.5 10.6,-5.5 10.6,5.5 -10.6,5.5 -10.6,-5.5
Top Component Center:
  lines w0.05: -1,0 1,0 ; 0,-1 0,1
Top Designator:
  text "'.Designator'" at -1.64,0.203 h0.65
  text "'.Comment'" at -1.64,-0.5 h0.65
3D body "HONGFA_HFD27.x_t": height 11.5, standoff -3, extent -10.1,-5 10.1,5

## HWSON50P200X300X80-8TP [mm]
height 0.8
pads (9):
  rrect20% 0.625x0.25 smd: 1(-1.412,0.75) 2(-1.412,0.25) 3(-1.412,-0.25) 4(-1.412,-0.75) 5(1.412,-0.75) 6(1.412,-0.25) 7(1.412,0.25) 8(1.412,0.75)
  rrect5% 1.6x1.6 smd paste-0.45: 9(0,0)
Top Overlay:
  lines w0.2: -2.075,0.725 -2.075,1.225 -1.2,1.225
Top Assembly:
  circle w0.1: c-1,0.5 r0.2
  lines w0.1: -1.5,-1 1.5,-1 1.5,1 -1.5,1 -1.5,-1
Top Courtyard:
  lines w0.05: -1.975,-1.25 -1.975,1.25 1.975,1.25 1.975,-1.25 -1.975,-1.25
Top Component Center:
  lines w0.05: -0.5,0 0.5,0 ; 0,-0.5 0,0.5
Top Designator:
  text "'.Designator'" at -1.45,0.401 h0.65
  text "'.Comment'" at -1.45,-0.76 h0.65
3D body "HWSON_HWSON50P200X300X80-8TP.x_t": height 0.81, standoff 0.01, extent -1.51,-1 1.51,1

## INDC1005(0402)X50 [mm] "Chip Inductor, 2-Leads, Body 1.00x0.50mm"
height 0.5
pads (2):
  rrect20% 0.6x0.6 smd: 1(-0.45,0) 2(0.45,0)
Top Assembly:
  rectangle: 0.325,-0.325 0.5,0.325
  rectangle: -0.5,-0.325 -0.325,0.325
  lines w0.1: -0.325,0.325 -0.162,-0.325 ; -0.081,0.325 0.081,-0.325 ; 0.162,0.325 0.325,-0.325 ; -0.5,0.325 0.5,0.325 0.5,-0.325 ; -0.5,0.325 -0.5,0.325 ; -0.5,0.325 -0.5,-0.325 0.5,-0.325 ; 0.5,-0.325 0.5,-0.325 ; 0.5,-0.325 0.5,-0.325
Top Courtyard:
  lines w0.05: -0.875,-0.425 0.875,-0.425 0.875,0.425 -0.875,0.425 -0.875,-0.425
Top Component Center:
  lines w0.05: -0.2,0 0.2,0 ; 0,-0.2 0,0.2
Top Designator:
  text "'.Comment'" at 0.625,-0.376 h0.55
  text "'.Designator'" at 0.625,0.015 h0.6
3D body "INDC-SMD-0402(1005).step": height 0.5, standoff 0, extent -0.5,-0.25 0.5,0.25

## INDC1608(0603)X85 [mm] "Chip Inductor, 2-Leads, Body 1.55x0.85mm"
height 0.85
pads (2):
  rrect20% 0.75x0.9 smd: 1(-0.75,0) 2(0.75,0)
Top Assembly:
  region: 0.8,0.4 0.5,0.4 0.5,-0.4 0.8,-0.4
  rectangle: -0.8,-0.4 -0.5,0.4
  lines w0.1: -0.5,0.4 -0.3,-0.4 ; -0.233,0.4 -0.033,-0.4 ; 0.033,0.4 0.234,-0.4 ; 0.3,0.4 0.5,-0.4 ; -0.8,-0.4 -0.8,0.4 0.8,0.4 0.8,-0.4 -0.8,-0.4
Top Courtyard:
  lines w0.05: -1.325,-0.635 1.325,-0.635 1.325,0.635 -1.325,0.635 -1.325,-0.635
Top Component Center:
  lines w0.05: -0.3,0 0.3,0 ; 0,-0.3 0,0.3
Top Designator:
  text "'.Comment'" at 0.925,-0.457 h0.65
  text "'.Designator'" at 0.925,0.029 h0.65
3D body "INDC-SMD-0603(1608).step": height 0.8, standoff 0, extent -0.8,-0.4 0.8,0.4

## INDC2012(0805)X120 [mm] "Chip Inductor, 2-Leads, Body 2.00x1.20mm"
height 1.2
pads (2):
  rrect20% 1x1.4 smd: 1(-1,0) 2(1,0)
Top Assembly:
  region: 1,0.625 0.625,0.625 0.625,-0.625 1,-0.625
  rectangle: -1,-0.625 -0.625,0.625
  lines w0.1: -0.625,0.625 -0.312,-0.625 ; -0.313,0.625 0,-0.624 ; 0,0.625 0.313,-0.624 ; 0.312,0.625 0.625,-0.625 ; -1,-0.625 -1,0.625 1,0.625 1,-0.625 -1,-0.625
Top Courtyard:
  lines w0.05: -1.7,-0.9 -1.7,0.9 1.7,0.9 1.7,-0.9 -1.7,-0.9
Top Component Center:
  lines w0.05: -0.4,0 0.4,0 ; 0,-0.4 0,0.4
Top Designator:
  text "'.Comment'" at 1.125,-0.482 h0.65
  text "'.Designator'" at 1.125,0.076 h0.65
3D body "INDC-SMD-0805(2012).step": height 1.25, standoff 0, extent -1,-0.625 1,0.625

## KLS_KLS7-SRLS-102-A3 [mm]
height 10.6
pads (5):
  round 2.2 hole 1.1: 1(-5.08,-2.54) 1(-5.08,2.54)
  oval 2.2x2 hole 1.1: 1(0,-2.54) 1(0,0) 1(0,2.54)
Top Assembly:
  lines w0.1: -13.475,-2 -8.975,-2 ; -13.475,2 -8.975,2 ; 0.025,-2.94 0.405,-2.94 0.405,-2.14 0.025,-2.14 ; 0.025,-0.4 0.405,-0.4 0.405,0.4 0.025,0.4 ; 0.025,2.14 0.405,2.14 0.405,2.94 0.025,2.94 ; -19.425,-5.632 ccw(c-19.046,-5.76) -19.129,-6.151 -13.475,-7.35 -13.475,7.35 -19.129,6.151 ccw(c-19.046,5.76) -19.425,5.631 cw(c-36.029,0) -19.425,-5.632 ; -8.975,-4.1 0.025,-4.1 0.025,4.1 -8.975,4.1 -8.975,-4.1
Top Designator:
  text "'.Designator'" at -13.015,0.078 h0.65
  text "'.Comment'" at -13.015,-0.625 h0.65
3D body "KLS_KLS7-SRLS-102-A3.x_t": height 5.2, standoff -3.3, extent -19.444,-7.35 0.405,7.35